# Altium footprint library SMT.PcbLib: 151 footprints (part 3 of 10)
Each footprint in its own frame and in the unit in brackets; x right, y up, seen from the top. Pads: shape width x height; smd on the part's side, far side on the other; paste and mask are expansions set on the pad; w line width, h text height; cw(c..) or ccw(c..) is an arc to the next point about the centre after c.
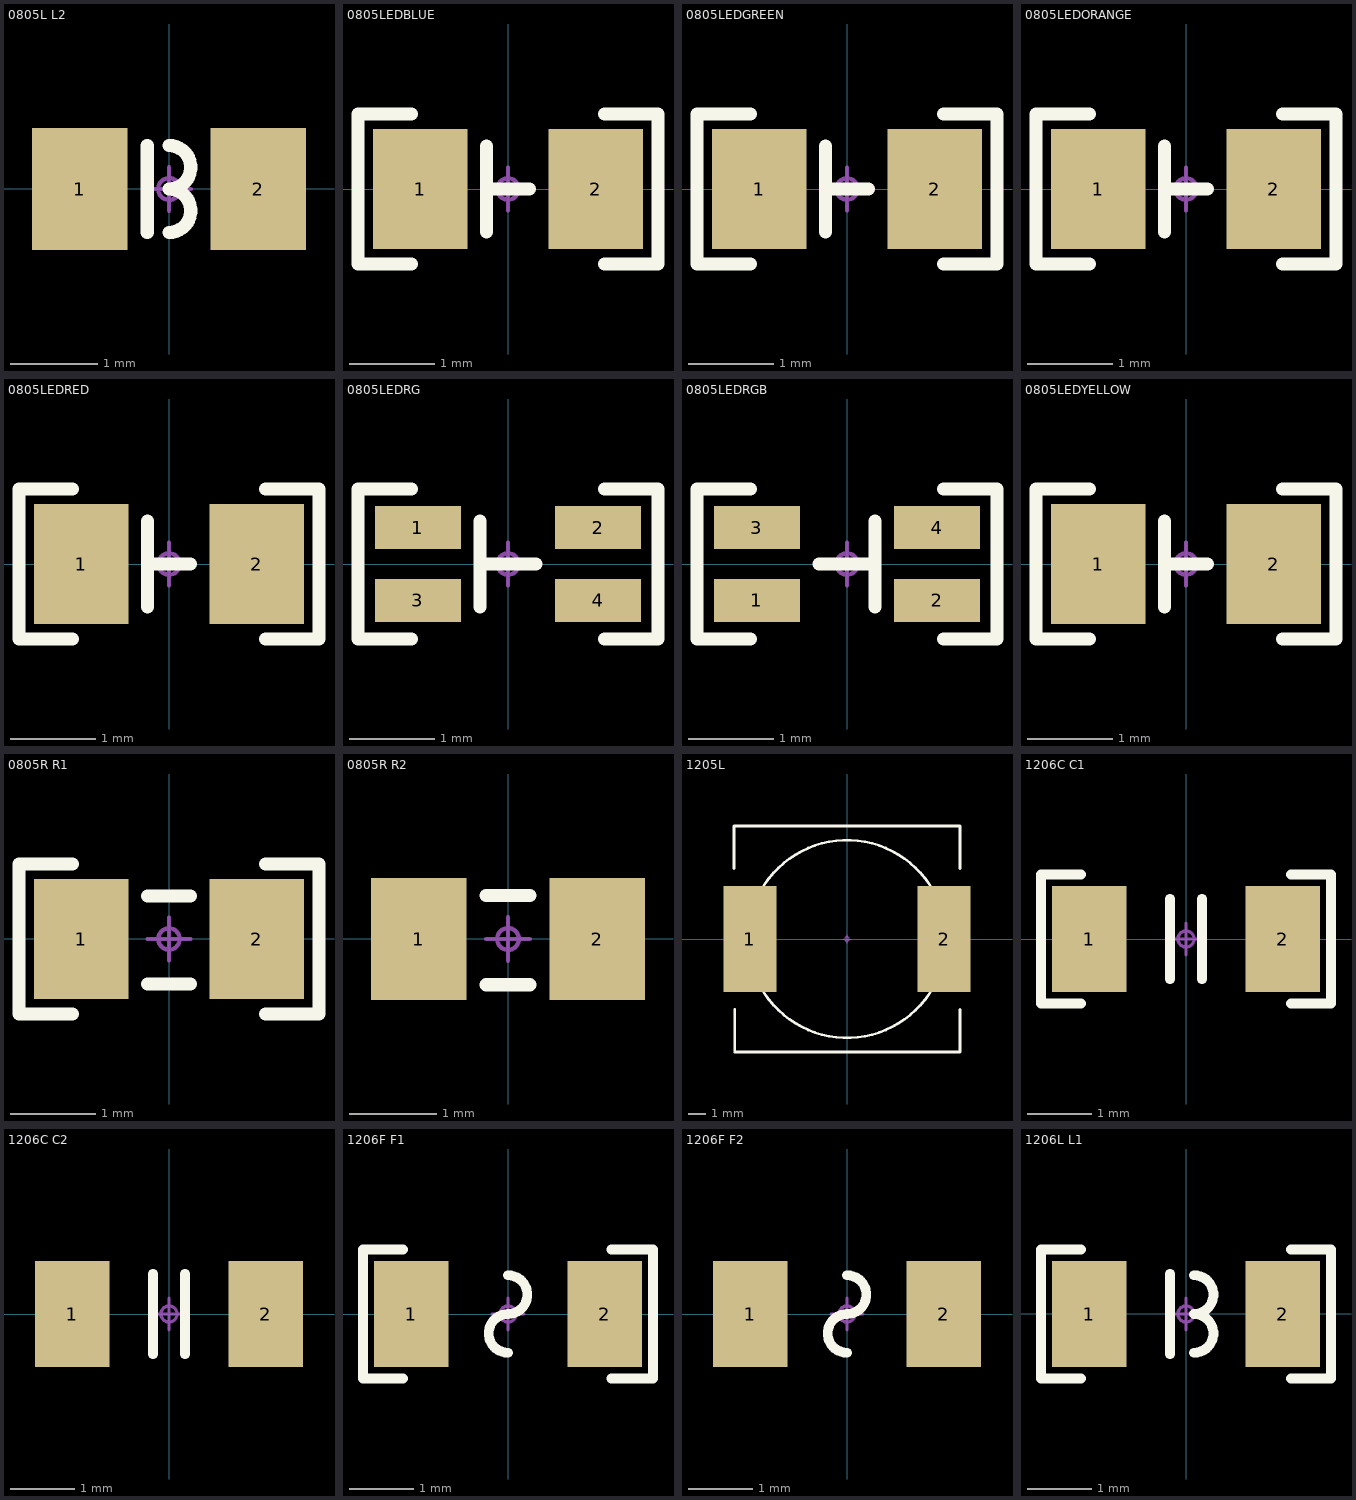
[diagram p2: the footprints below, top view; thin cyan lines are the x and y axes]

## 0805L L2 [mm]
pads (2):
  rect 1.1x1.4 smd paste-0.02: 1(-1.025,0) 2(1.025,0)
Top Overlay:
  lines w0.152: -0.25,-0.5 -0.25,0.5 ; 0,-0.5 ccw(c0,-0.25) 0,0 ccw(c0,0.25) 0,0.5
Mechanical 15:
  circle w0.05: c0,0 r0.125
  lines w0.05: -0.25,0 0.25,0 ; 0,-0.25 0,0.25
3D body "R0805.STEP": height 0.55, standoff 0, extent -1,-0.63 1,0.63

## 0805LEDBLUE [mm]
pads (2):
  rect 1.1x1.4 smd paste-0.02: 1(-1.025,0) 2(1.025,0)
Top Overlay:
  lines w0.152: -1.125,-0.875 -1.75,-0.875 -1.75,0.875 -1.125,0.875 ; -0.25,-0.5 -0.25,0.5 ; -0.25,0 0.25,0 ; 1.125,-0.875 1.75,-0.875 1.75,0.875 1.125,0.875
Mechanical 15:
  circle w0.05: c0,0 r0.125
  lines w0.05: -0.25,0 0.25,0 ; 0,-0.25 0,0.25
3D body "User Library-led_0805LED0805_blue.STEP": height 1.1, standoff 0, extent -1.01,-0.625 1.01,0.625

## 0805LEDGREEN [mm]
pads (2):
  rect 1.1x1.4 smd paste-0.02: 1(-1.025,0) 2(1.025,0)
Top Overlay:
  lines w0.152: -1.125,-0.875 -1.75,-0.875 -1.75,0.875 -1.125,0.875 ; -0.25,-0.5 -0.25,0.5 ; -0.25,0 0.25,0 ; 1.125,-0.875 1.75,-0.875 1.75,0.875 1.125,0.875
Mechanical 15:
  circle w0.05: c0,0 r0.125
  lines w0.05: -0.25,0 0.25,0 ; 0,-0.25 0,0.25
3D body "User Library-led_0805LED0805_green.STEP": height 1.1, standoff 0, extent -1.01,-0.625 1.01,0.625

## 0805LEDORANGE [mm]
pads (2):
  rect 1.1x1.4 smd paste-0.02: 1(-1.025,0) 2(1.025,0)
Top Overlay:
  lines w0.152: -1.125,-0.875 -1.75,-0.875 -1.75,0.875 -1.125,0.875 ; -0.25,-0.5 -0.25,0.5 ; -0.25,0 0.25,0 ; 1.125,-0.875 1.75,-0.875 1.75,0.875 1.125,0.875
Mechanical 15:
  circle w0.05: c0,0 r0.125
  lines w0.05: -0.25,0 0.25,0 ; 0,-0.25 0,0.25
3D body "User Library-led_0805LED0805_orange.STEP": height 1.1, standoff 0, extent -1.01,-0.625 1.01,0.625

## 0805LEDRED [mm]
pads (2):
  rect 1.1x1.4 smd paste-0.02: 1(-1.025,0) 2(1.025,0)
Top Overlay:
  lines w0.152: -1.125,-0.875 -1.75,-0.875 -1.75,0.875 -1.125,0.875 ; -0.25,-0.5 -0.25,0.5 ; -0.25,0 0.25,0 ; 1.125,-0.875 1.75,-0.875 1.75,0.875 1.125,0.875
Mechanical 15:
  circle w0.05: c0,0 r0.125
  lines w0.05: -0.25,0 0.25,0 ; 0,-0.25 0,0.25
3D body "User Library-led_0805LED0805_red.STEP": height 1.1, standoff 0, extent -1.01,-0.625 1.01,0.625

## 0805LEDRG [mm]
pads (4):
  rect 1x0.5 smd paste-0.02: 1(-1.05,0.425) 2(1.05,0.425) 3(-1.05,-0.425) 4(1.05,-0.425)
Top Overlay:
  lines w0.152: -1.125,-0.875 -1.75,-0.875 -1.75,0.875 -1.125,0.875 ; -0.325,-0.5 -0.325,0.5 ; -0.325,0 0.325,0 ; 1.125,-0.875 1.75,-0.875 1.75,0.875 1.125,0.875
Mechanical 15:
  circle w0.05: c0,0 r0.125
  lines w0.05: -0.25,0 0.25,0 ; 0,-0.25 0,0.25
3D body "User Library-led_0805LED0805_yellow.STEP": height 1.1, standoff 0, extent -1.01,-0.625 1.01,0.625

## 0805LEDRGB [mm]
pads (4):
  rect 1x0.5 smd paste-0.02: 1(-1.05,-0.425) 2(1.05,-0.425) 3(-1.05,0.425) 4(1.05,0.425)
Top Overlay:
  lines w0.152: -1.125,-0.875 -1.75,-0.875 -1.75,0.875 -1.125,0.875 ; -0.325,0 0.325,0 ; 0.325,-0.5 0.325,0.5 ; 1.125,-0.875 1.75,-0.875 1.75,0.875 1.125,0.875
Mechanical 15:
  circle w0.05: c0,0 r0.125
  lines w0.05: -0.25,0 0.25,0 ; 0,-0.25 0,0.25
3D body "User Library-led_0805LED0805_yellow.STEP": height 1.1, standoff 0, extent -1.01,-0.625 1.01,0.625

## 0805LEDYELLOW [mm]
pads (2):
  rect 1.1x1.4 smd paste-0.02: 1(-1.025,0) 2(1.025,0)
Top Overlay:
  lines w0.152: -1.125,-0.875 -1.75,-0.875 -1.75,0.875 -1.125,0.875 ; -0.25,-0.5 -0.25,0.5 ; -0.25,0 0.25,0 ; 1.125,-0.875 1.75,-0.875 1.75,0.875 1.125,0.875
Mechanical 15:
  circle w0.05: c0,0 r0.125
  lines w0.05: -0.25,0 0.25,0 ; 0,-0.25 0,0.25
3D body "User Library-led_0805LED0805_yellow.STEP": height 1.1, standoff 0, extent -1.01,-0.625 1.01,0.625

## 0805R R1 [mm]
pads (2):
  rect 1.1x1.4 smd paste-0.02: 1(-1.025,0) 2(1.025,0)
Top Overlay:
  lines w0.152: -1.125,-0.875 -1.75,-0.875 -1.75,0.875 -1.125,0.875 ; -0.25,-0.525 0.25,-0.525 ; -0.25,0.5 0.25,0.5 ; 1.125,-0.875 1.75,-0.875 1.75,0.875 1.125,0.875
Mechanical 15:
  circle w0.05: c0,0 r0.125
  lines w0.05: -0.25,0 0.25,0 ; 0,-0.25 0,0.25
3D body "RESC2012X06L.step": height 0.6, standoff 0, extent -1,-0.625 1,0.625

## 0805R R2 [mm]
pads (2):
  rect 1.1x1.4 smd paste-0.02: 1(-1.025,0) 2(1.025,0)
Top Overlay:
  lines w0.152: -0.25,-0.525 0.25,-0.525 ; -0.25,0.5 0.25,0.5
Mechanical 15:
  circle w0.05: c0,0 r0.125
  lines w0.05: -0.25,0 0.25,0 ; 0,-0.25 0,0.25
3D body "RESC2012X06L.step": height 0.6, standoff 0, extent -1,-0.625 1,0.625

## 1205L [mm]
height 3.1
pads (2):
  rect 3x6 smd: 1(-5.5,0) 2(5.5,0)
Top Overlay:
  circle w0.152: c0,0 r5.601
  lines w0.152: -6.4,4 -6.4,6.4 6.4,6.4 6.4,4 ; -6.36,-4 -6.36,-6.4 6.4,-6.4 6.4,-4
Mechanical 15:
  circle w0.05: c0,0 r0.125
  lines w0.05: -0.25,0 0.25,0 ; 0,-0.25 0,0.25
3D body "ms125.stp": height 5.95, standoff -0.3, extent -6,-6.1 6,5.9
3D body "6-3-ms125.stp": height 0.02, standoff 0, extent 4,-3 7,3
3D body "6-3-ms125.stp": height 0.02, standoff 0, extent -7,-3 -4,3

## 1206C C1 [mm]
pads (2):
  rect 1.15x1.65 smd paste-0.05: 1(-1.5,0) 2(1.5,0)
Top Overlay:
  lines w0.152: -1.625,-1 -2.25,-1 -2.25,1 -1.625,1 ; -0.25,-0.625 -0.25,0.625 ; 0.25,-0.625 0.25,0.625 ; 1.625,-1 2.25,-1 2.25,1 1.625,1
Mechanical 15:
  circle w0.05: c0,0 r0.125
  lines w0.05: -0.25,0 0.25,0 ; 0,-0.25 0,0.25
3D body "1206-c.stp": height 1.6, standoff 0, extent -1.6,-0.8 1.6,0.8

## 1206C C2 [mm]
pads (2):
  rect 1.15x1.65 smd paste-0.05: 1(-1.5,0) 2(1.5,0)
Top Overlay:
  lines w0.152: -0.25,-0.625 -0.25,0.625 ; 0.25,-0.625 0.25,0.625
Mechanical 15:
  circle w0.05: c0,0 r0.125
  lines w0.05: -0.25,0 0.25,0 ; 0,-0.25 0,0.25
3D body "1206-c.stp": height 1.6, standoff 0, extent -1.6,-0.8 1.6,0.8

## 1206F F1 [mm]
pads (2):
  rect 1.15x1.65 smd paste-0.05: 1(-1.5,0) 2(1.5,0)
Top Overlay:
  lines w0.152: -1.625,-1 -2.25,-1 -2.25,1 -1.625,1 ; 0,-0.6 cw(c0,-0.3) 0,0 ccw(c0,0.3) 0,0.6 ; 1.6,-1 2.25,-1 2.25,1 1.6,1
Mechanical 15:
  circle w0.05: c0,0 r0.125
  lines w0.05: -0.25,0 0.25,0 ; 0,-0.25 0,0.25
3D body "R1206.STEP": height 0.6, standoff 0, extent -1.6,-0.8 1.6,0.8

## 1206F F2 [mm]
pads (2):
  rect 1.15x1.65 smd paste-0.05: 1(-1.5,0) 2(1.5,0)
Top Overlay:
  lines w0.152: 0,-0.6 cw(c0,-0.3) 0,0 ccw(c0,0.3) 0,0.6
Mechanical 15:
  circle w0.05: c0,0 r0.125
  lines w0.05: -0.25,0 0.25,0 ; 0,-0.25 0,0.25
3D body "R1206.STEP": height 0.6, standoff 0, extent -1.6,-0.8 1.6,0.8

## 1206L L1 [mm]
pads (2):
  rect 1.15x1.65 smd paste-0.05: 1(-1.5,0) 2(1.5,0)
Top Overlay:
  lines w0.152: -1.625,-1 -2.25,-1 -2.25,1 -1.625,1 ; -0.25,-0.625 -0.25,0.625 ; 0.125,-0.6 ccw(c0.125,-0.3) 0.125,0 ccw(c0.125,0.3) 0.125,0.6 ; 1.625,-1 2.25,-1 2.25,1 1.625,1
Mechanical 15:
  circle w0.05: c0,0 r0.125
  lines w0.05: -0.25,0 0.25,0 ; 0,-0.25 0,0.25
3D body "R1206.STEP": height 0.6, standoff 0, extent -1.6,-0.8 1.6,0.8